# Altium footprint library HARTING THD.PcbLib: 113 footprints (part 2 of 11)
Each footprint in its own frame and in the unit in brackets; x right, y up, seen from the top. Pads: shape width x height; smd on the part's side, far side on the other; paste and mask are expansions set on the pad; w line width, h text height; cw(c..) or ccw(c..) is an arc to the next point about the centre after c.
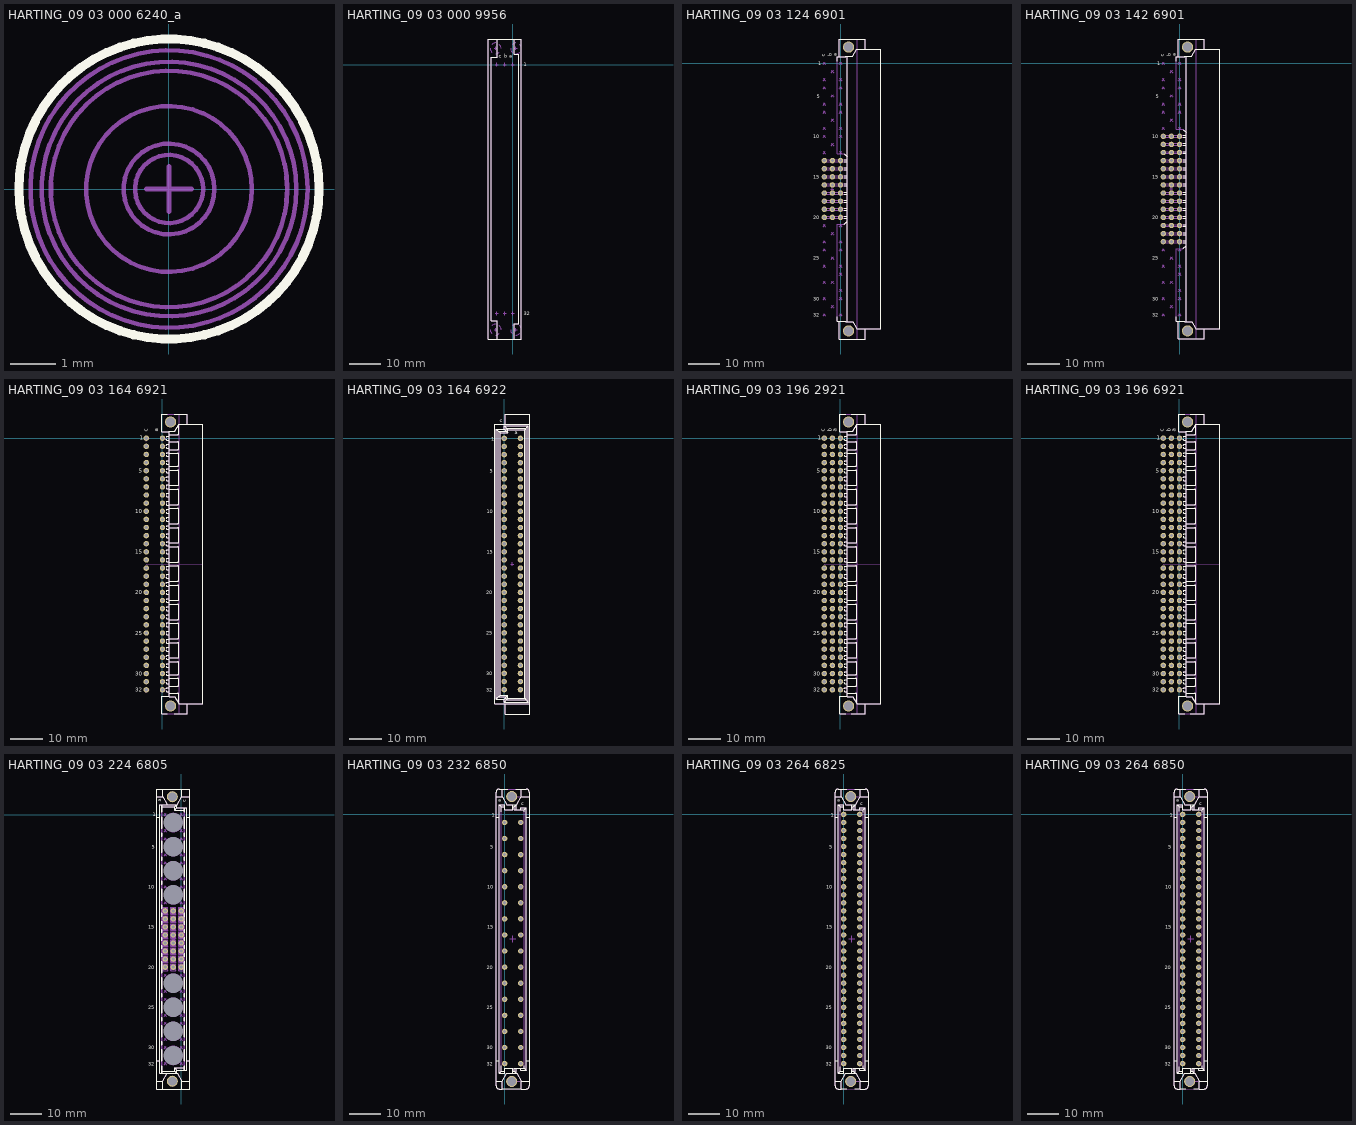
[diagram p1: the footprints below, top view; thin cyan lines are the x and y axes]

## HARTING_09 03 000 6240_a [mm] "DIN-41612 Type M, 2.8kV Special High Voltage Female Contacts"
height 18.8
Top Overlay:
  circle w0.2: c0,0 r3.3
Mechanical 8:
  circle w0.1: c0,0 r3.05
  lines w0.1: -0.5,0 0,0 ; 0,-0.5 0,0 ; 0,0.5 0,0 ; 0.5,0 0,0
Mechanical 14:
  circle w0.1: c0,0 r2.6
  circle w0.1: c0,0 r2.8
  circle w0.1: c0,0 r0.75
  circle w0.1: c0,0 r1.825
  circle w0.1: c0,0 r1
3D body "HARTING_09 03 000 6240_a.stp": height 11.1, standoff -7.5, extent -2.79,-2.8 2.791,2.8

## HARTING_09 03 000 9956 [mm] "64 Positions, Rear-Shroud Backplane Connector for DIN 41612 Type C and R Press-in Connectors (a=6.70mm)"
height 13.05
Top Overlay:
  lines w0.2: -4.965,-86.82 -4.965,-81.07 -6.915,-81.07 -6.915,2.33 -4.965,2.33 -4.965,8.08 ; 0.485,-86.82 0.485,-82.02 1.835,-82.02 1.835,3.28 0.485,3.28 0.485,8.08 ; -7.79,-86.82 2.71,-86.82 2.71,8.08 -7.79,8.08 -7.79,-86.82
  text "32" at 3.45,-79.37 h1.2
  text "1" at 3.505,-0.575 h1.2
  text "c" at -4.4,2.2 h1.2
  text "a" at -1.1,2.2 h1.2
  text "b" at -2.75,2.2 h1.2
Mechanical 8:
  lines w0.1: -7.14,-83.87 ccw(c-5.44,-83.87) -6.642,-85.072 ; -7.14,5.13 ccw(c-5.44,5.13) -6.642,3.928 ; -6.642,-82.668 cw(c-5.44,-83.87) -5.44,-82.17 ; -6.642,6.332 cw(c-5.44,5.13) -5.44,6.83 ; -5.94,-83.87 -5.44,-83.87 ; -5.94,5.13 -5.44,5.13 ; -5.58,-78.74 -5.08,-78.74 ; -5.58,0 -5.08,0 ; -5.44,-85.57 ccw(c-5.44,-83.87) -4.238,-85.072 ; -5.44,-84.37 -5.44,-83.87 ; -5.44,-83.37 -5.44,-83.87 ; -5.44,3.43 ccw(c-5.44,5.13) -4.238,3.928 ; -5.44,4.63 -5.44,5.13 ; -5.44,5.63 -5.44,5.13 ; -5.08,-79.24 -5.08,-78.74 ; -5.08,-78.24 -5.08,-78.74 ; -5.08,-0.5 -5.08,0 ; -5.08,0.5 -5.08,0 ; -4.94,-83.87 -5.44,-83.87 ; -4.94,5.13 -5.44,5.13 ; -4.58,-78.74 -5.08,-78.74 ; -4.58,0 -5.08,0 ; -4.238,-82.668 cw(c-5.44,-83.87) -3.74,-83.87 ; -4.238,6.332 cw(c-5.44,5.13) -3.74,5.13 ; -3.04,-78.74 -2.54,-78.74 ; -3.04,0 -2.54,0 ; -2.54,-79.24 -2.54,-78.74 ; -2.54,-78.24 -2.54,-78.74 ; -2.54,-0.5 -2.54,0 ; -2.54,0.5 -2.54,0 ; -2.04,-78.74 -2.54,-78.74 ; -2.04,0 -2.54,0 ; -0.74,-83.87 ccw(c0.96,-83.87) -0.242,-85.072 ; -0.74,5.13 ccw(c0.96,5.13) -0.242,3.928 ; -0.5,-78.74 0,-78.74 ; -0.5,0 0,0 ; -0.242,-82.668 cw(c0.96,-83.87) 0.96,-82.17 ; -0.242,6.332 cw(c0.96,5.13) 0.96,6.83 ; 0,-79.24 0,-78.74 ; 0,-78.24 0,-78.74 ; 0,-0.5 0,0 ; 0,0.5 0,0 ; 0.46,-83.87 0.96,-83.87 ; 0.46,5.13 0.96,5.13 ; 0.5,-78.74 0,-78.74 ; 0.5,0 0,0 ; 0.96,-85.57 ccw(c0.96,-83.87) 2.162,-85.072 ; 0.96,-84.37 0.96,-83.87 ; 0.96,-83.37 0.96,-83.87 ; 0.96,3.43 ccw(c0.96,5.13) 2.162,3.928 ; 0.96,4.63 0.96,5.13 ; 0.96,5.63 0.96,5.13 ; 1.46,-83.87 0.96,-83.87 ; 1.46,5.13 0.96,5.13 ; 2.162,-82.668 cw(c0.96,-83.87) 2.66,-83.87 ; 2.162,6.332 cw(c0.96,5.13) 2.66,5.13
Mechanical 14:
  lines w0.1: -4.965,-86.82 -4.965,-81.07 -6.915,-81.07 -6.915,2.33 -4.965,2.33 -4.965,8.08 ; 0.485,-86.82 0.485,-82.02 1.835,-82.02 1.835,3.28 0.485,3.28 0.485,8.08 ; -7.79,-86.82 2.71,-86.82 2.71,8.08 -7.79,8.08 -7.79,-86.82
  text "32" at 3.45,-79.37 h1.2
  text "1" at 3.505,-0.575 h1.2
  text "c" at -4.4,2.2 h1.2
  text "a" at -1.1,2.2 h1.2
  text "b" at -2.75,2.2 h1.2
3D body "HARTING_09 03 000 9956.stp": height 13.05, standoff 0, extent -7.79,-86.82 2.71,8.08

## HARTING_09 03 124 6901 [mm] "DIN 41612, Type M, Thru-Hole; Lead 3.0 mm, Pitch 2.54mm, Rows a+b+c, 24 Signal Contacts + 8 Positions for Special Contacts, Right Angle Male Connector, Performance level 2"
height 11
pads (26):
  round 1.7 hole 1: a13(0,-30.48) a14(0,-33.02) a15(0,-35.56) a16(0,-38.1) a17(0,-40.64) a18(0,-43.18) a19(0,-45.72) a20(0,-48.26) b13(-2.54,-30.48) b14(-2.54,-33.02) b15(-2.54,-35.56) b16(-2.54,-38.1) b17(-2.54,-40.64) b18(-2.54,-43.18) b19(-2.54,-45.72) b20(-2.54,-48.26) c13(-5.08,-30.48) c14(-5.08,-33.02) c15(-5.08,-35.56) c16(-5.08,-38.1) c17(-5.08,-40.64) c18(-5.08,-43.18) c19(-5.08,-45.72) c20(-5.08,-48.26)
  round 3.5 / inner round 3.5 / far side round 5.1 hole 2.8: MTG1(2.54,5.08) MTG2(2.54,-83.82)
Top Overlay:
  lines w0.2: -1.01,-79.477 -1.01,-80.82 1.64,-80.82 ; -1.01,0.736 -1.01,2.08 1.64,2.08 1.64,2.23 3.897,2.23 5.138,4.38 12.64,4.38 12.64,-83.12 5.138,-83.12 3.897,-80.97 1.64,-80.97 ; -0.36,-80.82 -0.36,-86.37 7.69,-86.37 7.69,-83.12 ; -0.36,2.08 -0.36,7.63 7.69,7.63 7.69,4.38 ; 1.164,-50.346 2.04,-49.47 ; 1.164,-28.394 2.04,-29.27 ; 1.213,-48.56 2.04,-48.56 ; 1.213,-47.96 2.04,-47.96 ; 1.213,-46.02 2.04,-46.02 ; 1.213,-45.42 2.04,-45.42 ; 1.213,-43.48 2.04,-43.48 ; 1.213,-42.88 2.04,-42.88 ; 1.213,-40.94 2.04,-40.94 ; 1.213,-40.34 2.04,-40.34 ; 1.213,-38.4 2.04,-38.4 ; 1.213,-37.8 2.04,-37.8 ; 1.213,-35.86 2.04,-35.86 ; 1.213,-35.26 2.04,-35.26 ; 1.213,-33.32 2.04,-33.32 ; 1.213,-32.72 2.04,-32.72 ; 1.213,-30.78 2.04,-30.78 ; 1.213,-30.18 2.04,-30.18 ; 2.04,-80.97 2.04,2.23
  text "30" at -8.57,-74.31 h1.2
  text "25" at -8.57,-61.61 h1.2
  text "20" at -8.57,-48.91 h1.2
  text "15" at -8.47,-36.11 h1.2
  text "10" at -8.495,-23.51 h1.2
  text "5" at -7.445,-10.86 h1.2
  text "32" at -8.57,-79.39 h1.2
  text "1" at -7.045,-0.55 h1.2
  text "c" at -4.9,2.125 h1.2
  text "b" at -2.75,2.18 h1.2
  text "a" at -1.175,2.15 h1.2
Mechanical 8:
  drawing of 266 lines, arcs and shapes, not listed
  text "PCB" at 5.08,-41.275 h1.2
Mechanical 14:
  circle w0.1: c2.54,5.08 r1.25
  circle w0.1: c2.54,-83.82 r1.25
  lines w0.1: -0.36,-80.82 -0.36,-86.37 7.69,-86.37 7.69,-83.12 ; -0.36,2.08 -0.36,7.63 7.69,7.63 7.69,4.38 ; 1.64,-80.97 3.897,-80.97 5.138,-83.12 12.64,-83.12 12.64,4.38 5.138,4.38 3.897,2.23 1.64,2.23 1.64,2.08 -1.01,2.08 -1.01,-28.32 1.09,-28.32 2.04,-29.27 ; 1.64,-80.82 -1.01,-80.82 -1.01,-50.42 1.09,-50.42 2.04,-49.47 ; 2.04,-80.97 2.04,2.23 ; 2.04,-48.56 -5.38,-48.56 -5.38,-47.96 2.04,-47.96 ; 2.04,-46.02 -5.38,-46.02 -5.38,-45.42 2.04,-45.42 ; 2.04,-43.48 -5.38,-43.48 -5.38,-42.88 2.04,-42.88 ; 2.04,-40.94 -5.38,-40.94 -5.38,-40.34 2.04,-40.34 ; 2.04,-38.4 -5.38,-38.4 -5.38,-37.8 2.04,-37.8 ; 2.04,-35.86 -5.38,-35.86 -5.38,-35.26 2.04,-35.26 ; 2.04,-33.32 -5.38,-33.32 -5.38,-32.72 2.04,-32.72 ; 2.04,-30.78 -5.38,-30.78 -5.38,-30.18 2.04,-30.18
  text "a" at -1.175,2.15 h1.2
  text "b" at -2.75,2.18 h1.2
  text "c" at -4.9,2.125 h1.2
  text "30" at -8.57,-74.31 h1.2
  text "25" at -8.57,-61.61 h1.2
  text "20" at -8.57,-48.91 h1.2
  text "15" at -8.47,-36.11 h1.2
  text "10" at -8.495,-23.51 h1.2
  text "5" at -7.445,-10.86 h1.2
  text "32" at -8.57,-79.39 h1.2
  text "1" at -7.045,-0.55 h1.2
3D body "HARTING_09 03 124 6901.stp": height 9.35, standoff -3, extent -5.38,-86.37 12.64,7.63

## HARTING_09 03 142 6901 [mm] "DIN 41612, Type M, Thru-Hole; Lead 3.0 mm, Pitch 2.54mm, Rows a+b+c, 42 Signal Contacts + 6 Positions for Special Contacts, Right Angle Male Connector, Performance level 2"
height 11
pads (44):
  round 1.7 hole 1: a10(0,-22.86) a11(0,-25.4) a12(0,-27.94) a13(0,-30.48) a14(0,-33.02) a15(0,-35.56) a16(0,-38.1) a17(0,-40.64) a18(0,-43.18) a19(0,-45.72) a20(0,-48.26) a21(0,-50.8) a22(0,-53.34) a23(0,-55.88) b10(-2.54,-22.86) b11(-2.54,-25.4) b12(-2.54,-27.94) b13(-2.54,-30.48) b14(-2.54,-33.02) b15(-2.54,-35.56) b16(-2.54,-38.1) b17(-2.54,-40.64) b18(-2.54,-43.18) b19(-2.54,-45.72) b20(-2.54,-48.26) b21(-2.54,-50.8) b22(-2.54,-53.34) b23(-2.54,-55.88) c10(-5.08,-22.86) c11(-5.08,-25.4) c12(-5.08,-27.94) c13(-5.08,-30.48) c14(-5.08,-33.02) c15(-5.08,-35.56) c16(-5.08,-38.1) c17(-5.08,-40.64) c18(-5.08,-43.18) c19(-5.08,-45.72) c20(-5.08,-48.26) c21(-5.08,-50.8) c22(-5.08,-53.34) c23(-5.08,-55.88)
  round 3.5 / inner round 3.5 / far side round 5.1 hole 2.8: MTG1(2.54,5.08) MTG2(2.54,-83.82)
Top Overlay:
  lines w0.2: -1.01,-79.476 -1.01,-80.82 1.64,-80.82 ; -1.01,0.736 -1.01,2.08 1.64,2.08 1.64,2.23 3.897,2.23 5.138,4.38 12.64,4.38 12.64,-83.12 5.138,-83.12 3.897,-80.97 1.64,-80.97 ; -0.36,-80.82 -0.36,-86.37 7.69,-86.37 7.69,-83.12 ; -0.36,2.08 -0.36,7.63 7.69,7.63 7.69,4.38 ; 1.164,-57.966 2.04,-57.09 ; 1.164,-20.774 2.04,-21.65 ; 1.213,-56.18 2.04,-56.18 ; 1.213,-55.58 2.04,-55.58 ; 1.213,-53.64 2.04,-53.64 ; 1.213,-53.04 2.04,-53.04 ; 1.213,-51.1 2.04,-51.1 ; 1.213,-50.5 2.04,-50.5 ; 1.213,-48.56 2.04,-48.56 ; 1.213,-47.96 2.04,-47.96 ; 1.213,-46.02 2.04,-46.02 ; 1.213,-45.42 2.04,-45.42 ; 1.213,-43.48 2.04,-43.48 ; 1.213,-42.88 2.04,-42.88 ; 1.213,-40.94 2.04,-40.94 ; 1.213,-40.34 2.04,-40.34 ; 1.213,-38.4 2.04,-38.4 ; 1.213,-37.8 2.04,-37.8 ; 1.213,-35.86 2.04,-35.86 ; 1.213,-35.26 2.04,-35.26 ; 1.213,-33.32 2.04,-33.32 ; 1.213,-32.72 2.04,-32.72 ; 1.213,-30.78 2.04,-30.78 ; 1.213,-30.18 2.04,-30.18 ; 1.213,-28.24 2.04,-28.24 ; 1.213,-27.64 2.04,-27.64 ; 1.213,-25.7 2.04,-25.7 ; 1.213,-25.1 2.04,-25.1 ; 1.213,-23.16 2.04,-23.16 ; 1.213,-22.56 2.04,-22.56 ; 2.04,-80.97 2.04,2.23
  text "30" at -8.57,-74.31 h1.2
  text "25" at -8.57,-61.61 h1.2
  text "20" at -8.57,-48.91 h1.2
  text "15" at -8.47,-36.11 h1.2
  text "10" at -8.495,-23.51 h1.2
  text "5" at -7.445,-10.86 h1.2
  text "32" at -8.57,-79.39 h1.2
  text "1" at -7.045,-0.55 h1.2
  text "c" at -4.9,2.125 h1.2
  text "b" at -2.75,2.18 h1.2
  text "a" at -1.175,2.15 h1.2
Mechanical 8:
  drawing of 307 lines, arcs and shapes, not listed
  text "PCB" at 5.08,-41.275 h1.2
Mechanical 14:
  circle w0.1: c2.54,-83.82 r1.25
  circle w0.1: c2.54,5.08 r1.25
  lines w0.1: -0.36,-80.82 -0.36,-86.37 7.69,-86.37 7.69,-83.12 ; -0.36,2.08 -0.36,7.63 7.69,7.63 7.69,4.38 ; 1.64,-80.97 3.897,-80.97 5.138,-83.12 12.64,-83.12 12.64,4.38 5.138,4.38 3.897,2.23 1.64,2.23 1.64,2.08 -1.01,2.08 -1.01,-20.7 1.09,-20.7 2.04,-21.65 ; 1.64,-80.82 -1.01,-80.82 -1.01,-58.04 1.09,-58.04 2.04,-57.09 ; 2.04,-80.97 2.04,2.23 ; 2.04,-56.18 -5.38,-56.18 -5.38,-55.58 2.04,-55.58 ; 2.04,-53.64 -5.38,-53.64 -5.38,-53.04 2.04,-53.04 ; 2.04,-51.1 -5.38,-51.1 -5.38,-50.5 2.04,-50.5 ; 2.04,-48.56 -5.38,-48.56 -5.38,-47.96 2.04,-47.96 ; 2.04,-46.02 -5.38,-46.02 -5.38,-45.42 2.04,-45.42 ; 2.04,-43.48 -5.38,-43.48 -5.38,-42.88 2.04,-42.88 ; 2.04,-40.94 -5.38,-40.94 -5.38,-40.34 2.04,-40.34 ; 2.04,-38.4 -5.38,-38.4 -5.38,-37.8 2.04,-37.8 ; 2.04,-35.86 -5.38,-35.86 -5.38,-35.26 2.04,-35.26 ; 2.04,-33.32 -5.38,-33.32 -5.38,-32.72 2.04,-32.72 ; 2.04,-30.78 -5.38,-30.78 -5.38,-30.18 2.04,-30.18 ; 2.04,-28.24 -5.38,-28.24 -5.38,-27.64 2.04,-27.64 ; 2.04,-25.7 -5.38,-25.7 -5.38,-25.1 2.04,-25.1 ; 2.04,-23.16 -5.38,-23.16 -5.38,-22.56 2.04,-22.56
  text "a" at -1.175,2.15 h1.2
  text "b" at -2.75,2.18 h1.2
  text "c" at -4.9,2.125 h1.2
  text "30" at -8.57,-74.31 h1.2
  text "25" at -8.57,-61.61 h1.2
  text "20" at -8.57,-48.91 h1.2
  text "15" at -8.47,-36.11 h1.2
  text "10" at -8.495,-23.51 h1.2
  text "5" at -7.445,-10.86 h1.2
  text "32" at -8.57,-79.39 h1.2
  text "1" at -7.045,-0.55 h1.2
3D body "HARTING_09 03 142 6901.stp": height 9.35, standoff -3, extent -5.38,-86.37 12.64,7.63

## HARTING_09 03 164 6921 [mm] "Connector; DIN 41612, Type C, Thru-Hole; Rows a+c, 64 Position; Right Angle"
height 9.35
pads (66):
  round 1.7 hole 1: a1(0,0) a2(0,-2.54) a3(0,-5.08) a4(0,-7.62) a5(0,-10.16) a6(0,-12.7) a7(0,-15.24) a8(0,-17.78) a9(0,-20.32) a10(0,-22.86) a11(0,-25.4) a12(0,-27.94) a13(0,-30.48) a14(0,-33.02) a15(0,-35.56) a16(0,-38.1) a17(0,-40.64) a18(0,-43.18) a19(0,-45.72) a20(0,-48.26) a21(0,-50.8) a22(0,-53.34) a23(0,-55.88) a24(0,-58.42) a25(0,-60.96) a26(0,-63.5) a27(0,-66.04) a28(0,-68.58) a29(0,-71.12) a30(0,-73.66) a31(0,-76.2) a32(0,-78.74) c1(-5.08,0) c2(-5.08,-2.54) c3(-5.08,-5.08) c4(-5.08,-7.62) c5(-5.08,-10.16) c6(-5.08,-12.7) c7(-5.08,-15.24) c8(-5.08,-17.78) c9(-5.08,-20.32) c10(-5.08,-22.86) c11(-5.08,-25.4) c12(-5.08,-27.94) c13(-5.08,-30.48) c14(-5.08,-33.02) c15(-5.08,-35.56) c16(-5.08,-38.1) c17(-5.08,-40.64) c18(-5.08,-43.18) c19(-5.08,-45.72) c20(-5.08,-48.26) c21(-5.08,-50.8) c22(-5.08,-53.34) c23(-5.08,-55.88) c24(-5.08,-58.42) c25(-5.08,-60.96) c26(-5.08,-63.5) c27(-5.08,-66.04) c28(-5.08,-68.58) c29(-5.08,-71.12) c30(-5.08,-73.66) c31(-5.08,-76.2) c32(-5.08,-78.74)
  round 3.5 / inner round 3.5 / far side round 5.1 hole 2.8: MTG1(2.54,5.08) MTG2(2.54,-83.82)
Top Overlay:
  drawing of 224 lines, arcs and shapes, not listed
  text "30" at -8.57,-74.31 h1.2
  text "25" at -8.57,-61.61 h1.2
  text "20" at -8.57,-48.91 h1.2
  text "15" at -8.47,-36.11 h1.2
  text "10" at -8.495,-23.51 h1.2
  text "5" at -7.445,-10.86 h1.2
  text "32" at -8.57,-79.39 h1.2
  text "a" at -1.325,2.09 h1.2
  text "c" at -4.58,2.04 h1.2
  text "1" at -7.045,-0.55 h1.2
Mechanical 8:
  lines w0.1: -5.08,-79.74 -5.08,-78.74 -4.08,-78.74 ; -5.08,-39.37 12.64,-39.37 ; -5.08,-1 -5.08,0 -4.08,0 ; 0,-79.74 0,-78.74 1,-78.74 ; 0,-1 0,0 1,0 ; 2.54,-84.82 2.54,-83.82 3.54,-83.82 ; 2.54,4.08 2.54,5.08 3.54,5.08 ; 5.3,-86.32 5.3,7.58
  text "PCB" at 5.08,-41.275 h1.2
Mechanical 14:
  drawing of 222 lines, arcs and shapes, not listed
  text "30" at -8.57,-74.31 h1.2
  text "25" at -8.57,-61.61 h1.2
  text "20" at -8.57,-48.91 h1.2
  text "15" at -8.47,-36.11 h1.2
  text "10" at -8.495,-23.51 h1.2
  text "5" at -7.445,-10.86 h1.2
  text "32" at -8.57,-79.39 h1.2
  text "a" at -1.325,2.09 h1.2
  text "c" at -4.58,2.04 h1.2
  text "1" at -7.045,-0.55 h1.2
3D body "HARTING_09 03 164 6921.stp": height 9.4, standoff -3, extent -5.38,-86.37 12.64,7.63

## HARTING_09 03 164 6922 [mm] "DIN 41612, Type C,  Thru-Hole; Rows a+c, 64 Position, Performance level 2, Lead 3mm, Pitch 2.54mm, Straight Male Connector"
height 13
pads (64):
  round 1.7 hole 1: a1(5.08,0) a2(5.08,-2.54) a3(5.08,-5.08) a4(5.08,-7.62) a5(5.08,-10.16) a6(5.08,-12.7) a7(5.08,-15.24) a8(5.08,-17.78) a9(5.08,-20.32) a10(5.08,-22.86) a11(5.08,-25.4) a12(5.08,-27.94) a13(5.08,-30.48) a14(5.08,-33.02) a15(5.08,-35.56) a16(5.08,-38.1) a17(5.08,-40.64) a18(5.08,-43.18) a19(5.08,-45.72) a20(5.08,-48.26) a21(5.08,-50.8) a22(5.08,-53.34) a23(5.08,-55.88) a24(5.08,-58.42) a25(5.08,-60.96) a26(5.08,-63.5) a27(5.08,-66.04) a28(5.08,-68.58) a29(5.08,-71.12) a30(5.08,-73.66) a31(5.08,-76.2) a32(5.08,-78.74) c1(0,0) c2(0,-2.54) c3(0,-5.08) c4(0,-7.62) c5(0,-10.16) c6(0,-12.7) c7(0,-15.24) c8(0,-17.78) c9(0,-20.32) c10(0,-22.86) c11(0,-25.4) c12(0,-27.94) c13(0,-30.48) c14(0,-33.02) c15(0,-35.56) c16(0,-38.1) c17(0,-40.64) c18(0,-43.18) c19(0,-45.72) c20(0,-48.26) c21(0,-50.8) c22(0,-53.34) c23(0,-55.88) c24(0,-58.42) c25(0,-60.96) c26(0,-63.5) c27(0,-66.04) c28(0,-68.58) c29(0,-71.12) c30(0,-73.66) c31(0,-76.2) c32(0,-78.74)
Top Overlay:
  lines w0.2: 0.39,-83.121 0.39,-86.37 8.04,-86.37 8.04,7.63 0.39,7.63 0.39,4.38 ; 8.04,-83.12 -2.96,-83.12 -2.96,4.38 8.04,4.38 ; -2.46,-81.67 -2.46,2.93 ; -2.46,-81.67 -0.06,-81.67 ; -2.46,-81.67 -1.81,-81.02 ; -2.46,2.93 -0.06,2.93 ; -2.46,2.93 -1.31,1.78 ; -1.81,-81.02 -1.81,2.28 0.59,2.28 0.59,3.23 6.89,3.23 6.89,-81.97 0.59,-81.97 0.59,-81.02 -1.81,-81.02 ; -1.81,-81.02 -1.31,-80.52 ; -1.31,-80.52 -1.31,1.78 ; -1.31,-80.52 1.09,-80.52 ; -1.31,1.78 1.09,1.78 ; -0.06,-82.62 -0.06,-81.67 ; -0.06,-82.62 7.54,-82.62 ; -0.06,-82.62 1.09,-81.47 ; -0.06,-81.67 1.09,-80.52 ; -0.06,2.93 -0.06,3.88 ; -0.06,2.93 1.09,1.78 ; -0.06,3.88 7.54,3.88 ; -0.06,3.88 1.09,2.73 ; 1.09,-81.47 1.09,-80.52 ; 1.09,-81.47 6.39,-81.47 ; 1.09,1.78 1.09,2.73 ; 1.09,2.73 6.39,2.73 ; 6.39,-81.47 6.39,2.73 ; 6.39,-81.47 7.54,-82.62 ; 6.39,2.73 7.54,3.88 ; 7.54,-82.62 7.54,3.88
  text "10" at -5.475,-23.46 h1.2
  text "c" at -1.445,5.06 h1.2
  text "a" at 3.249,1.235 h1.2
  text "32" at -5.675,-79.365 h1.2
  text "5" at -4.55,-10.835 h1.2
  text "30" at -5.675,-74.285 h1.2
  text "25" at -5.675,-61.585 h1.2
  text "20" at -5.675,-48.885 h1.2
  text "15" at -5.475,-36.135 h1.2
  text "1" at -4.075,-0.675 h1.2
Mechanical 8:
  drawing of 260 lines, arcs and shapes, not listed
Mechanical 14:
  lines w0.1: 0.39,-83.121 0.39,-86.37 8.04,-86.37 8.04,7.63 0.39,7.63 0.39,4.38 ; 8.04,-83.12 -2.96,-83.12 -2.96,4.38 8.04,4.38 ; -2.46,-81.67 -2.46,2.93 ; -2.46,-81.67 -0.06,-81.67 ; -2.46,-81.67 -1.81,-81.02 ; -2.46,2.93 -0.06,2.93 ; -2.46,2.93 -1.31,1.78 ; -1.81,-81.02 -1.81,2.28 0.59,2.28 0.59,3.23 6.89,3.23 6.89,-81.97 0.59,-81.97 0.59,-81.02 -1.81,-81.02 ; -1.81,-81.02 -1.31,-80.52 ; -1.31,-80.52 -1.31,1.78 ; -1.31,-80.52 1.09,-80.52 ; -1.31,1.78 1.09,1.78 ; -0.06,-82.62 -0.06,-81.67 ; -0.06,-82.62 7.54,-82.62 ; -0.06,-82.62 1.09,-81.47 ; -0.06,-81.67 1.09,-80.52 ; -0.06,2.93 -0.06,3.88 ; -0.06,2.93 1.09,1.78 ; -0.06,3.88 7.54,3.88 ; -0.06,3.88 1.09,2.73 ; 1.09,-81.47 1.09,-80.52 ; 1.09,-81.47 6.39,-81.47 ; 1.09,1.78 1.09,2.73 ; 1.09,2.73 6.39,2.73 ; 6.39,-81.47 6.39,2.73 ; 6.39,-81.47 7.54,-82.62 ; 6.39,2.73 7.54,3.88 ; 7.54,-82.62 7.54,3.88
  text "10" at -5.475,-23.46 h1.2
  text "32" at -5.675,-79.365 h1.2
  text "5" at -4.55,-10.835 h1.2
  text "30" at -5.675,-74.285 h1.2
  text "25" at -5.675,-61.585 h1.2
  text "20" at -5.675,-48.885 h1.2
  text "15" at -5.475,-36.135 h1.2
  text "1" at -4.075,-0.675 h1.2
  text "a" at 3.249,1.235 h1.2
  text "c" at -1.445,5.06 h1.2
3D body "HARTING_09 03 164 6922.stp": height 13, standoff -3, extent -2.96,-86.37 8.04,7.63

## HARTING_09 03 196 2921 [mm] "Connector; DIN 41612, Type C, Thru-Hole; Rows a+b+c, 96 Position; Right Angle"
height 11
pads (98):
  round 1.7 hole 1: a1(0,0) a2(0,-2.54) a3(0,-5.08) a4(0,-7.62) a5(0,-10.16) a6(0,-12.7) a7(0,-15.24) a8(0,-17.78) a9(0,-20.32) a10(0,-22.86) a11(0,-25.4) a12(0,-27.94) a13(0,-30.48) a14(0,-33.02) a15(0,-35.56) a16(0,-38.1) a17(0,-40.64) a18(0,-43.18) a19(0,-45.72) a20(0,-48.26) a21(0,-50.8) a22(0,-53.34) a23(0,-55.88) a24(0,-58.42) a25(0,-60.96) a26(0,-63.5) a27(0,-66.04) a28(0,-68.58) a29(0,-71.12) a30(0,-73.66) a31(0,-76.2) a32(0,-78.74) b1(-2.54,0) b2(-2.54,-2.54) b3(-2.54,-5.08) b4(-2.54,-7.62) b5(-2.54,-10.16) b6(-2.54,-12.7) b7(-2.54,-15.24) b8(-2.54,-17.78) b9(-2.54,-20.32) b10(-2.54,-22.86) b11(-2.54,-25.4) b12(-2.54,-27.94) b13(-2.54,-30.48) b14(-2.54,-33.02) b15(-2.54,-35.56) b16(-2.54,-38.1) b17(-2.54,-40.64) b18(-2.54,-43.18) b19(-2.54,-45.72) b20(-2.54,-48.26) b21(-2.54,-50.8) b22(-2.54,-53.34) b23(-2.54,-55.88) b24(-2.54,-58.42) b25(-2.54,-60.96) b26(-2.54,-63.5) b27(-2.54,-66.04) b28(-2.54,-68.58) b29(-2.54,-71.12) b30(-2.54,-73.66) b31(-2.54,-76.2) b32(-2.54,-78.74) c1(-5.08,0) c2(-5.08,-2.54) c3(-5.08,-5.08) c4(-5.08,-7.62) c5(-5.08,-10.16) c6(-5.08,-12.7) c7(-5.08,-15.24) c8(-5.08,-17.78) c9(-5.08,-20.32) c10(-5.08,-22.86) c11(-5.08,-25.4) c12(-5.08,-27.94) c13(-5.08,-30.48) c14(-5.08,-33.02) c15(-5.08,-35.56) c16(-5.08,-38.1) c17(-5.08,-40.64) c18(-5.08,-43.18) c19(-5.08,-45.72) c20(-5.08,-48.26) c21(-5.08,-50.8) c22(-5.08,-53.34) c23(-5.08,-55.88) c24(-5.08,-58.42) c25(-5.08,-60.96) c26(-5.08,-63.5) c27(-5.08,-66.04) c28(-5.08,-68.58) c29(-5.08,-71.12) c30(-5.08,-73.66) c31(-5.08,-76.2) c32(-5.08,-78.74)
  round 3.5 / inner round 3.5 / far side round 5.1 hole 2.8: MTG1(2.54,5.08) MTG2(2.54,-83.82)
Top Overlay:
  drawing of 227 lines, arcs and shapes, not listed
  text "30" at -8.57,-74.31 h1.2
  text "25" at -8.57,-61.61 h1.2
  text "20" at -8.57,-48.91 h1.2
  text "15" at -8.47,-36.11 h1.2
  text "10" at -8.495,-23.51 h1.2
  text "5" at -7.445,-10.86 h1.2
  text "32" at -8.57,-79.39 h1.2
  text "1" at -7.045,-0.55 h1.2
  text "c" at -4.9,2.025 h1.2
  text "b" at -2.75,2.08 h1.2
  text "a" at -1.175,2.05 h1.2
Mechanical 8:
  lines w0.1: -5.08,-39.37 12.64,-39.37 ; 5.3,-86.3 5.3,7.5
  text "PCB" at 5.08,-41.275 h1.2
Mechanical 14:
  drawing of 161 lines, arcs and shapes, not listed
  text "a" at -1.175,2.05 h1.2
  text "b" at -2.75,2.08 h1.2
  text "c" at -4.9,2.025 h1.2
  text "30" at -8.57,-74.31 h1.2
  text "25" at -8.57,-61.61 h1.2
  text "20" at -8.57,-48.91 h1.2
  text "15" at -8.47,-36.11 h1.2
  text "10" at -8.495,-23.51 h1.2
  text "5" at -7.445,-10.86 h1.2
  text "32" at -8.57,-79.39 h1.2
  text "1" at -7.045,-0.55 h1.2
  text "c" at -4.445,-0.635 h1.2
  text "a" at 0.635,-0.635 h1.2
3D body "HARTING_09 03 196 2921.stp": height 9.35, standoff -3, extent -5.38,-86.37 12.64,7.63
